# Altium footprint library AI.PcbLib: 137 footprints (part 2 of 9)
Each footprint in its own frame and in the unit in brackets; x right, y up, seen from the top. Pads: shape width x height; smd on the part's side, far side on the other; paste and mask are expansions set on the pad; w line width, h text height; cw(c..) or ccw(c..) is an arc to the next point about the centre after c.
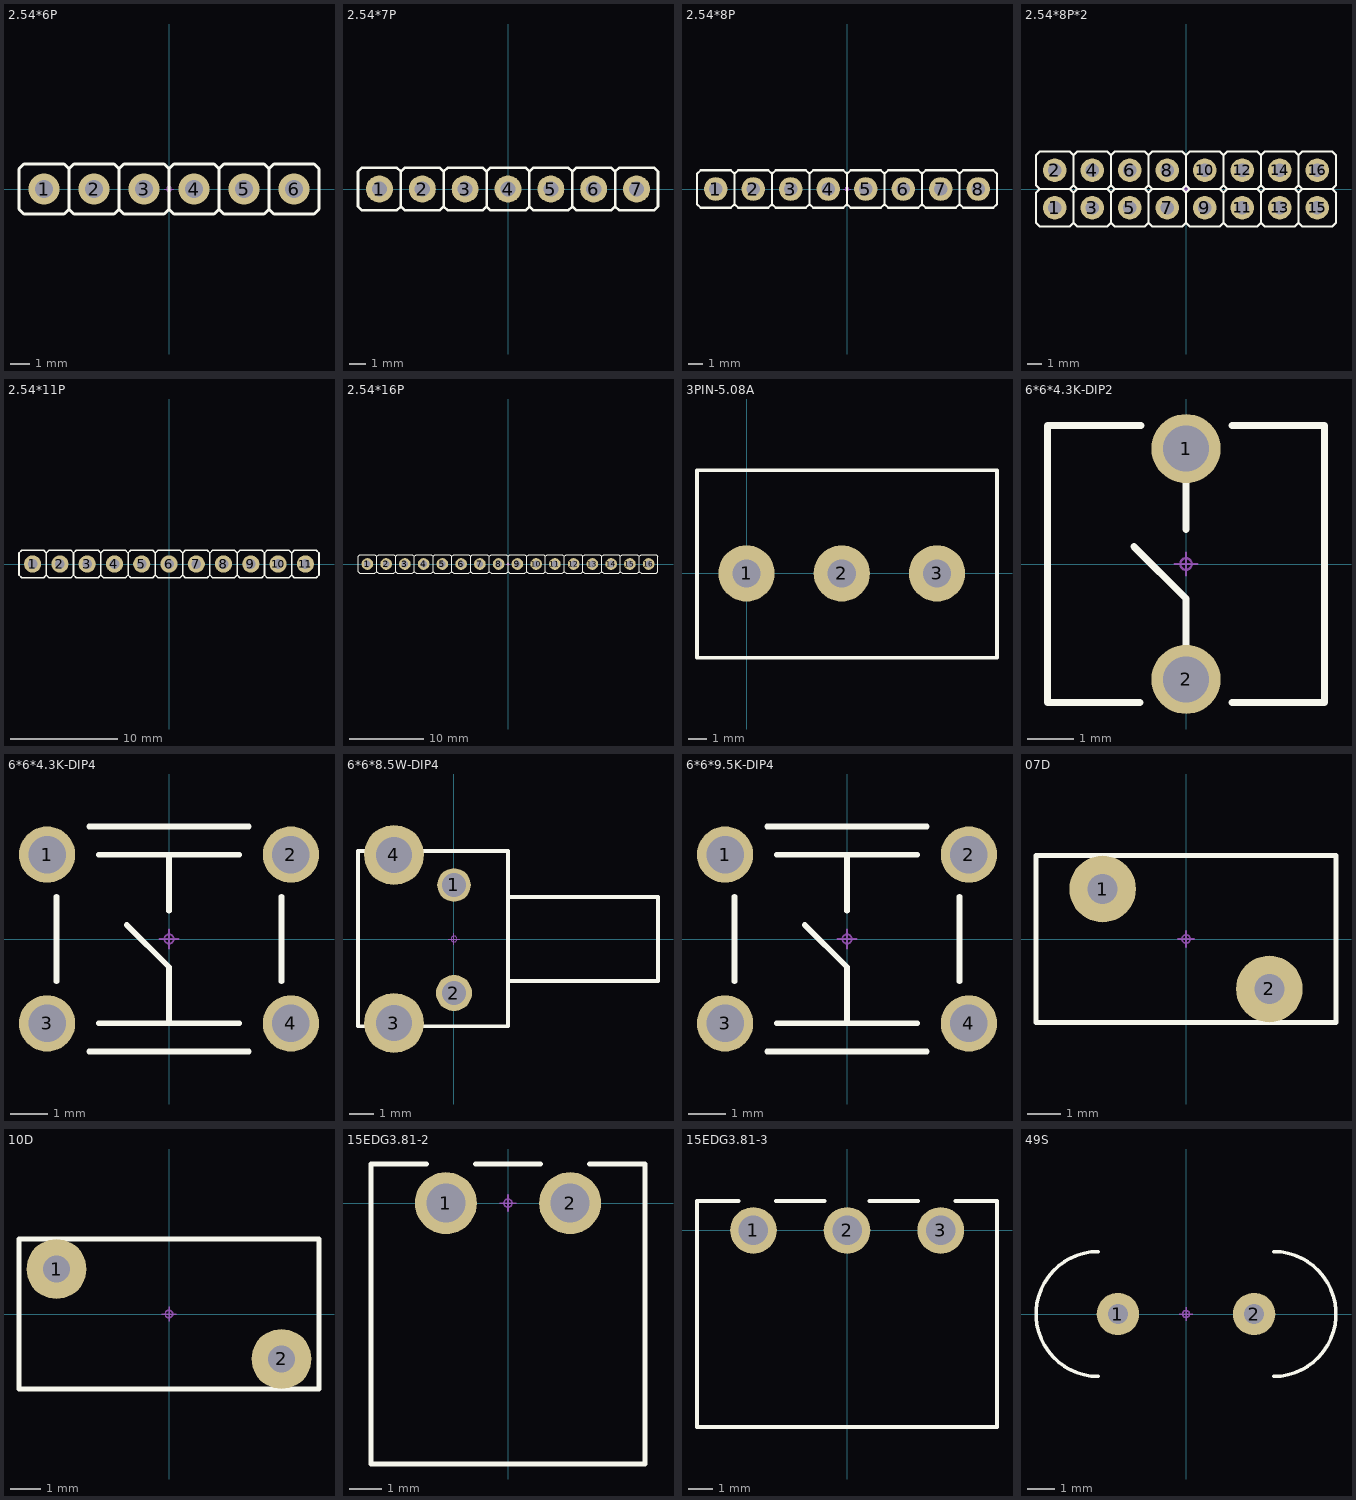
[diagram p1: the footprints below, top view; thin cyan lines are the x and y axes]

## 2.54*6P [mm]
pads (6):
  round 1.6 hole 0.9: 1(-6.35,0) 2(-3.81,0) 3(-1.27,0) 4(1.27,0) 5(3.81,0) 6(6.35,0)
Top Overlay:
  lines w0.152: -5.08,-1.025 -5.325,-1.27 -7.375,-1.27 -7.62,-1.025 -7.62,1.025 -7.375,1.27 -5.325,1.27 -5.08,1.025 ; -5.08,-1.025 -5.08,1.025 ; -5.08,-1.025 -4.835,-1.27 -2.785,-1.27 -2.54,-1.025 ; -5.08,1.025 -4.835,1.27 -2.785,1.27 -2.54,1.025 ; -2.54,-1.025 -2.54,1.025 ; -2.54,-1.025 -2.295,-1.27 -0.245,-1.27 0,-1.025 ; -2.54,1.025 -2.295,1.27 -0.245,1.27 0,1.025 ; 0,-1.025 0,1.025 ; 0,-1.025 0.245,-1.27 2.295,-1.27 2.54,-1.025 ; 0,1.025 0.245,1.27 2.295,1.27 2.54,1.025 ; 2.54,-1.025 2.785,-1.27 4.835,-1.27 5.08,-1.025 ; 2.54,-1.025 2.54,1.025 ; 2.54,1.025 2.785,1.27 4.835,1.27 5.08,1.025 ; 5.08,-1.025 5.325,-1.27 7.375,-1.27 7.62,-1.025 7.62,1.025 7.375,1.27 5.325,1.27 5.08,1.025 ; 5.08,-1.025 5.08,1.025
Mechanical 15:
  circle w0.05: c0,0 r0.125
  lines w0.05: -0.25,0 0.25,0 ; 0,-0.25 0,0.25
3D body "COMATEL_386.0358.1.06.440.stp": height 8, standoff -3.2, extent -7.62,-1.225 7.62,1.225

## 2.54*7P [mm]
pads (7):
  round 1.6 hole 0.9: 1(-7.62,0) 2(-5.08,0) 3(-2.54,0) 4(0,0) 5(2.54,0) 6(5.08,0) 7(7.62,0)
Top Overlay:
  lines w0.152: -6.35,-1.025 -6.595,-1.27 -8.645,-1.27 -8.89,-1.025 -8.89,1.025 -8.645,1.27 -6.595,1.27 -6.35,1.025 ; -6.35,-1.025 -6.35,1.025 ; -6.35,-1.025 -6.105,-1.27 -4.055,-1.27 -3.81,-1.025 ; -6.35,1.025 -6.105,1.27 -4.055,1.27 -3.81,1.025 ; -3.81,-1.025 -3.81,1.025 ; -3.81,-1.025 -3.565,-1.27 -1.515,-1.27 -1.27,-1.025 ; -3.81,1.025 -3.565,1.27 -1.515,1.27 -1.27,1.025 ; -1.27,-1.025 -1.27,1.025 ; -1.27,-1.025 -1.025,-1.27 1.025,-1.27 1.27,-1.025 ; -1.27,1.025 -1.025,1.27 1.025,1.27 1.27,1.025 ; 1.27,-1.025 1.27,1.025 ; 1.27,-1.025 1.515,-1.27 3.565,-1.27 3.81,-1.025 ; 1.27,1.025 1.515,1.27 3.565,1.27 3.81,1.025 ; 3.81,-1.025 3.81,1.025 ; 3.81,-1.025 4.055,-1.27 6.105,-1.27 6.35,-1.025 ; 3.81,1.025 4.055,1.27 6.105,1.27 6.35,1.025 ; 6.35,-1.025 6.35,1.025 ; 6.35,-1.025 6.595,-1.27 8.645,-1.27 8.89,-1.025 8.89,1.025 8.645,1.27 6.595,1.27 6.35,1.025
Mechanical 15:
  circle w0.05: c0,0 r0.125
  lines w0.05: -0.25,0 0.25,0 ; 0,-0.25 0,0.25
3D body: height 8.54, standoff -3, extent -8.89,-1.27 8.89,1.27

## 2.54*8P [mm]
pads (8):
  round 1.6 hole 0.9: 1(-8.89,0) 2(-6.35,0) 3(-3.81,0) 4(-1.27,0) 5(1.27,0) 6(3.81,0) 7(6.35,0) 8(8.89,0)
Top Overlay:
  lines w0.152: -7.62,-1.025 -7.375,-1.27 -5.325,-1.27 -5.08,-1.025 ; -7.62,-1.025 -7.62,1.025 ; -7.62,-1.025 -7.865,-1.27 -9.915,-1.27 -10.16,-1.025 -10.16,1.025 -9.915,1.27 -7.865,1.27 -7.62,1.025 ; -7.62,1.025 -7.375,1.27 -5.325,1.27 -5.08,1.025 ; -5.08,-1.025 -4.835,-1.27 -2.785,-1.27 -2.54,-1.025 ; -5.08,-1.025 -5.08,1.025 ; -5.08,1.025 -4.835,1.27 -2.785,1.27 -2.54,1.025 ; -2.54,-1.025 -2.295,-1.27 -0.245,-1.27 0,-1.025 ; -2.54,-1.025 -2.54,1.025 ; -2.54,1.025 -2.295,1.27 -0.245,1.27 0,1.025 ; 0,-1.025 0.245,-1.27 2.295,-1.27 2.54,-1.025 ; 0,-1.025 0,1.025 ; 0,1.025 0.245,1.27 2.295,1.27 2.54,1.025 ; 2.54,-1.025 2.785,-1.27 4.835,-1.27 5.08,-1.025 ; 2.54,-1.025 2.54,1.025 ; 2.54,1.025 2.785,1.27 4.835,1.27 5.08,1.025 ; 5.08,-1.025 5.325,-1.27 7.375,-1.27 7.62,-1.025 ; 5.08,-1.025 5.08,1.025 ; 5.08,1.025 5.325,1.27 7.375,1.27 7.62,1.025 ; 7.62,-1.025 7.865,-1.27 9.915,-1.27 10.16,-1.025 10.16,1.025 9.915,1.27 7.865,1.27 7.62,1.025 ; 7.62,-1.025 7.62,1.025
Mechanical 15:
  circle w0.05: c0,0 r0.125
  lines w0.05: -0.25,0 0.25,0 ; 0,-0.25 0,0.25
3D body "COMATEL_386.0358.1.08.440.stp": height 8, standoff -3.2, extent -10.16,-1.225 10.16,1.225

## 2.54*8P*2 [mm]
pads (16):
  round 1.6 hole 0.9: 1(-8.89,-1.27) 2(-8.89,1.27) 3(-6.35,-1.27) 4(-6.35,1.27) 5(-3.81,-1.27) 6(-3.81,1.27) 7(-1.27,-1.27) 8(-1.27,1.27) 9(1.27,-1.27) 10(1.27,1.27) 11(3.81,-1.27) 12(3.81,1.27) 13(6.35,-1.27) 14(6.35,1.27) 15(8.89,-1.27) 16(8.89,1.27)
Top Overlay:
  lines w0.152: -9.915,0 -7.865,0 ; -9.915,0 -10.16,-0.245 -10.16,-2.295 -9.915,-2.54 -7.865,-2.54 -7.62,-2.295 ; -9.915,0 -7.865,0 ; -9.915,0 -10.16,0.245 -10.16,2.295 -9.915,2.54 -7.865,2.54 -7.62,2.295 ; -7.865,0 -7.62,-0.245 ; -7.865,0 -7.62,0.245 ; -7.62,-2.295 -7.62,-0.245 ; -7.62,-2.295 -7.375,-2.54 -5.325,-2.54 -5.08,-2.295 ; -7.62,-0.245 -7.375,0 ; -7.62,0.245 -7.375,0 ; -7.62,0.245 -7.62,2.295 ; -7.62,2.295 -7.375,2.54 -5.325,2.54 -5.08,2.295 ; -7.375,0 -5.325,0 ; -7.375,0 -5.325,0 ; -5.325,0 -5.08,-0.245 ; -5.325,0 -5.08,0.245 ; -5.08,-2.295 -5.08,-0.245 ; -5.08,-2.295 -4.835,-2.54 -2.785,-2.54 -2.54,-2.295 ; -5.08,-0.245 -4.835,0 ; -5.08,0.245 -4.835,0 ; -5.08,0.245 -5.08,2.295 ; -5.08,2.295 -4.835,2.54 -2.785,2.54 -2.54,2.295 ; -4.835,0 -2.785,0 ; -4.835,0 -2.785,0 ; -2.785,0 -2.54,-0.245 ; -2.785,0 -2.54,0.245 ; -2.54,-2.295 -2.54,-0.245 ; -2.54,-2.295 -2.295,-2.54 -0.245,-2.54 0,-2.295 ; -2.54,-0.245 -2.295,0 ; -2.54,0.245 -2.295,0 ; -2.54,0.245 -2.54,2.295 ; -2.54,2.295 -2.295,2.54 -0.245,2.54 0,2.295 ; -2.295,0 -0.245,0 ; -2.295,0 -0.245,0 ; -0.245,0 0,-0.245 ; -0.245,0 0,0.245 ; 0,-2.295 0,-0.245 ; 0,-2.295 0.245,-2.54 2.295,-2.54 2.54,-2.295 ; 0,-0.245 0.245,0 ; 0,0.245 0.245,0 ; 0,0.245 0,2.295 ; 0,2.295 0.245,2.54 2.295,2.54 2.54,2.295 ; 0.245,0 2.295,0 ; 0.245,0 2.295,0 ; 2.295,0 2.54,-0.245 ; 2.295,0 2.54,0.245 ; 2.54,-2.295 2.54,-0.245 ; 2.54,-2.295 2.785,-2.54 4.835,-2.54 5.08,-2.295 ; 2.54,-0.245 2.785,0 ; 2.54,0.245 2.785,0 ; 2.54,0.245 2.54,2.295 ; 2.54,2.295 2.785,2.54 4.835,2.54 5.08,2.295 ; 2.785,0 4.835,0 ; 2.785,0 4.835,0 ; 4.835,0 5.08,-0.245 ; 4.835,0 5.08,0.245 ; 5.08,-2.295 5.08,-0.245 ; 5.08,-2.295 5.325,-2.54 7.375,-2.54 7.62,-2.295 ; 5.08,-0.245 5.325,0 ; 5.08,0.245 5.325,0 ; 5.08,0.245 5.08,2.295 ; 5.08,2.295 5.325,2.54 7.375,2.54 7.62,2.295 ; 5.325,0 7.375,0 ; 5.325,0 7.375,0 ; 7.375,0 7.62,-0.245 ; 7.375,0 7.62,0.245 ; 7.62,-2.295 7.62,-0.245 ; 7.62,-2.295 7.865,-2.54 9.915,-2.54 10.16,-2.295 10.16,-0.245 9.915,0 ; 7.62,-0.245 7.865,0 ; 7.62,0.245 7.865,0 ; 7.62,0.245 7.62,2.295 ; 7.62,2.295 7.865,2.54 9.915,2.54 10.16,2.295 10.16,0.245 9.915,0 ; 7.865,0 9.915,0 ; 7.865,0 9.915,0
Mechanical 15:
  circle w0.05: c0,0 r0.125
  lines w0.05: -0.25,0 0.25,0 ; 0,-0.25 0,0.25
3D body "COMATEL_386.0358.1.08.440.stp": height 8, standoff -3.2, extent -10.16,-2.495 10.16,-0.045
3D body "COMATEL_386.0358.1.08.440.stp": height 8, standoff -3.2, extent -10.16,0.045 10.16,2.495

## 2.54*11P [mm]
pads (11):
  round 1.6 hole 0.9: 1(-12.7,0) 2(-10.16,0) 3(-7.62,0) 4(-5.08,0) 5(-2.54,0) 6(0,0) 7(2.54,0) 8(5.08,0) 9(7.62,0) 10(10.16,0) 11(12.7,0)
Top Overlay:
  lines w0.152: 6.35,1.025 6.35,-1.025 ; -11.43,-1.025 -11.675,-1.27 -13.725,-1.27 -13.97,-1.025 -13.97,1.025 -13.725,1.27 -11.675,1.27 -11.43,1.025 ; -11.43,-1.025 -11.43,1.025 ; -11.43,-1.025 -11.185,-1.27 -9.135,-1.27 -8.89,-1.025 ; -11.43,1.025 -11.185,1.27 -9.135,1.27 -8.89,1.025 ; -8.89,-1.025 -8.89,1.025 ; -8.89,-1.025 -8.645,-1.27 -6.595,-1.27 -6.35,-1.025 ; -8.89,1.025 -8.645,1.27 -6.595,1.27 -6.35,1.025 ; -6.35,-1.025 -6.35,1.025 ; -6.35,-1.025 -6.105,-1.27 -4.055,-1.27 -3.81,-1.025 ; -6.35,1.025 -6.105,1.27 -4.055,1.27 -3.81,1.025 ; -3.81,-1.025 -3.81,1.025 ; -3.81,-1.025 -3.565,-1.27 -1.515,-1.27 -1.27,-1.025 ; -3.81,1.025 -3.565,1.27 -1.515,1.27 -1.27,1.025 ; -1.27,-1.025 -1.27,1.025 ; -1.27,-1.025 -1.025,-1.27 1.025,-1.27 1.27,-1.025 ; -1.27,1.025 -1.025,1.27 1.025,1.27 1.27,1.025 ; 1.27,-1.025 1.27,1.025 ; 1.27,-1.025 1.515,-1.27 3.565,-1.27 3.81,-1.025 ; 1.27,1.025 1.515,1.27 3.565,1.27 3.81,1.025 ; 3.81,-1.025 3.81,1.025 ; 3.81,-1.025 4.055,-1.27 6.105,-1.27 6.35,-1.025 ; 3.81,1.025 4.055,1.27 6.105,1.27 6.355,1.021 6.604,1.27 8.645,1.27 8.89,1.025 ; 6.35,-1.025 6.595,-1.27 8.645,-1.27 8.89,-1.025 ; 8.89,-1.025 9.135,-1.27 11.185,-1.27 11.43,-1.025 ; 8.89,-1.025 8.89,1.025 ; 8.89,1.025 9.135,1.27 11.185,1.27 11.43,1.025 ; 11.43,-1.025 11.675,-1.27 13.725,-1.27 13.97,-1.025 13.97,1.025 13.725,1.27 11.675,1.27 11.43,1.025 ; 11.43,-1.025 11.43,1.025
Mechanical 15:
  circle w0.05: c0,0 r0.125
  lines w0.05: -0.25,0 0.25,0 ; 0,-0.25 0,0.25
3D body: height 8.54, standoff -3, extent -13.97,-1.27 13.97,1.27

## 2.54*16P [mm]
pads (16):
  round 1.6 hole 0.9: 1(-19.05,0) 2(-16.51,0) 3(-13.97,0) 4(-11.43,0) 5(-8.89,0) 6(-6.35,0) 7(-3.81,0) 8(-1.27,0) 9(1.27,0) 10(3.81,0) 11(6.35,0) 12(8.89,0) 13(11.43,0) 14(13.97,0) 15(16.51,0) 16(19.05,0)
Top Overlay:
  lines w0.152: 0,1.025 0,-1.025 ; -17.78,-1.025 -17.535,-1.27 -15.485,-1.27 -15.24,-1.025 ; -17.78,-1.025 -17.78,1.025 ; -17.78,-1.025 -18.025,-1.27 -20.075,-1.27 -20.32,-1.025 -20.32,1.025 -20.075,1.27 -18.025,1.27 -17.78,1.025 ; -17.78,1.025 -17.535,1.27 -15.485,1.27 -15.24,1.025 ; -15.24,-1.025 -14.995,-1.27 -12.945,-1.27 -12.7,-1.025 ; -15.24,-1.025 -15.24,1.025 ; -15.24,1.025 -14.995,1.27 -12.945,1.27 -12.7,1.025 ; -12.7,-1.025 -12.455,-1.27 -10.405,-1.27 -10.16,-1.025 ; -12.7,-1.025 -12.7,1.025 ; -12.7,1.025 -12.455,1.27 -10.405,1.27 -10.16,1.025 ; -10.16,-1.025 -9.915,-1.27 -7.865,-1.27 -7.62,-1.025 ; -10.16,-1.025 -10.16,1.025 ; -10.16,1.025 -9.915,1.27 -7.865,1.27 -7.62,1.025 ; -7.62,-1.025 -7.375,-1.27 -5.325,-1.27 -5.08,-1.025 ; -7.62,-1.025 -7.62,1.025 ; -7.62,1.025 -7.375,1.27 -5.325,1.27 -5.08,1.025 ; -5.08,-1.025 -4.835,-1.27 -2.785,-1.27 -2.54,-1.025 ; -5.08,-1.025 -5.08,1.025 ; -5.08,1.025 -4.835,1.27 -2.785,1.27 -2.54,1.025 ; -2.54,-1.025 -2.295,-1.27 -0.245,-1.27 0,-1.025 ; -2.54,-1.025 -2.54,1.025 ; -2.54,1.025 -2.295,1.27 -0.245,1.27 0.005,1.021 0.254,1.27 2.295,1.27 2.54,1.025 ; 0,-1.025 0.245,-1.27 2.295,-1.27 2.54,-1.025 ; 2.54,-1.025 2.54,1.025 ; 2.54,-1.025 2.785,-1.27 4.835,-1.27 5.08,-1.025 ; 2.54,1.025 2.785,1.27 4.835,1.27 5.08,1.025 ; 5.08,-1.025 5.08,1.025 ; 5.08,-1.025 5.325,-1.27 7.375,-1.27 7.62,-1.025 ; 5.08,1.025 5.325,1.27 7.375,1.27 7.62,1.025 ; 7.62,-1.025 7.62,1.025 ; 7.62,-1.025 7.865,-1.27 9.915,-1.27 10.16,-1.025 ; 7.62,1.025 7.865,1.27 9.915,1.27 10.16,1.025 ; 10.16,-1.025 10.16,1.025 ; 10.16,-1.025 10.405,-1.27 12.455,-1.27 12.7,-1.025 ; 10.16,1.025 10.405,1.27 12.455,1.27 12.7,1.025 ; 12.7,-1.025 12.7,1.025 ; 12.7,-1.025 12.945,-1.27 14.995,-1.27 15.24,-1.025 ; 12.7,1.025 12.945,1.27 14.995,1.27 15.24,1.025 ; 15.24,-1.025 15.24,1.025 ; 15.24,-1.025 15.485,-1.27 17.535,-1.27 17.78,-1.025 ; 15.24,1.025 15.485,1.27 17.535,1.27 17.78,1.025 ; 17.78,-1.025 17.78,1.025 ; 17.78,-1.025 18.025,-1.27 20.075,-1.27 20.32,-1.025 20.32,1.025 20.075,1.27 18.025,1.27 17.78,1.025
Mechanical 15:
  circle w0.05: c0,0 r0.125
  lines w0.05: -0.25,0 0.25,0 ; 0,-0.25 0,0.25
3D body "HDR1x16.STEP": height 8.54, standoff -3, extent -20.32,-1.27 20.32,1.27

## 3PIN-5.08A [mm] "3A"
pads (3):
  round 3 hole 1.5: 1(0,0) 2(5.08,0) 3(10.16,0)
Top Overlay:
  lines w0.2: -2.642,-4.5 13.36,-4.5 13.36,5.5 -2.642,5.5 -2.642,-4.5
3D body "PHOENIX_1715734.stp": height 14.19, standoff -3.5, extent -2.661,-4.8 13.32,5

## 6*6*4.3K-DIP2 [mm]
pads (2):
  round 1.5 hole 1: 1(0,2.5) 2(0,-2.5)
Top Overlay:
  lines w0.152: -1.125,0.375 0,-0.75 0,-2.25 ; -1,-3 -3,-3 -3,3 -0.975,3 ; 0,0.75 0,2.25 ; 1,-3 3,-3 3,3 1,3
Mechanical 15:
  circle w0.05: c0,0 r0.125
  lines w0.05: -0.25,0 0.25,0 ; 0,-0.25 0,0.25
3D body "SW6X6.stp": height 4.3, standoff -14, extent -3.1,-3 3.1,3

## 6*6*4.3K-DIP4 [mm]
pads (4):
  round 1.5 hole 1: 1(-3.25,2.25) 2(3.25,2.25) 3(-3.25,-2.25) 4(3.25,-2.25)
Top Overlay:
  lines w0.152: -3,-1.125 -3,1.125 ; -2.125,-3 2.125,-3 ; -2.125,3 2.125,3 ; -1.875,-2.25 1.875,-2.25 ; -1.875,2.25 1.875,2.25 ; -1.125,0.375 0,-0.75 0,-2.25 ; 0,0.75 0,2.25 ; 3,-1.125 3,1.125
Mechanical 15:
  circle w0.05: c0,0 r0.125
  lines w0.05: -0.25,0 0.25,0 ; 0,-0.25 0,0.25
3D body "PB_OMRON_B3F-1000.stp": height 4.3, standoff -3.6, extent -3.4,-3.1 3.4,3.1

## 6*6*8.5W-DIP4 [mm]
pads (4):
  round 1.397 hole 1: 1(0,2.25)
  round 1.5 hole 1: 2(0,-2.25)
  round 2.5 hole 1.5: 3(-2.5,-3.5) 4(-2.5,3.5)
Top Overlay:
  lines w0.152: 2.25,-1.75 8.5,-1.75 8.5,1.75 2.25,1.75 ; -4,-3.634 2.25,-3.634 2.25,3.666 -4,3.666 -4,-3.634
Mechanical 15:
  circle w0.05: c0,0 r0.125
  lines w0.05: -0.25,0 0.25,0 ; 0,-0.25 0,0.25
3D body "qingchukaiguan.stp": height 7.4, standoff -3.2, extent -4.2,-4.35 8.6,4.35

## 6*6*9.5K-DIP4 [mm]
pads (4):
  round 1.5 hole 1: 1(-3.25,2.25) 2(3.25,2.25) 3(-3.25,-2.25) 4(3.25,-2.25)
Top Overlay:
  lines w0.152: -3,-1.125 -3,1.125 ; -2.125,-3 2.125,-3 ; -2.125,3 2.125,3 ; -1.875,-2.25 1.875,-2.25 ; -1.875,2.25 1.875,2.25 ; -1.125,0.375 0,-0.75 0,-2.25 ; 0,0.75 0,2.25 ; 3,-1.125 3,1.125
Mechanical 15:
  circle w0.05: c0,0 r0.125
  lines w0.05: -0.25,0 0.25,0 ; 0,-0.25 0,0.25
3D body "PB_OMRON_B3F-1070.stp": height 9.5, standoff -3.6, extent -3.4,-3.1 3.4,3.1

## 07D [mm]
pads (2):
  round 2 hole 0.9: 1(-2.5,1.5) 2(2.5,-1.5)
Top Overlay:
  lines w0.152: -4.5,-2.5 -4.5,2.5 4.5,2.5 4.5,-2.5 -4.5,-2.5
Mechanical 15:
  circle w0.05: c0,0 r0.125
  lines w0.05: -0.25,0 0.25,0 ; 0,-0.25 0,0.25
3D body "VAR_EPCOS_B72205S0461K101.stp": height 9, standoff -3.6, extent -3.5,-2.85 3.5,2.85

## 10D [mm]
pads (2):
  round 2 hole 0.9: 1(-3.75,1.5) 2(3.75,-1.5)
Top Overlay:
  lines w0.152: -5,-2.5 -5,2.5 5,2.5 5,-2.5 -5,-2.5
Mechanical 15:
  circle w0.05: c0,0 r0.125
  lines w0.05: -0.25,0 0.25,0 ; 0,-0.25 0,0.25
3D body "VAR_EPCOS_B72210S0461K101.stp": height 15, standoff -3.6, extent -6,-3.15 6,3.15

## 15EDG3.81-2 [mm]
pads (2):
  round 1.9 hole 1.2: 1(-1.905,0) 2(1.905,0)
Top Overlay:
  lines w0.152: -2.5,1.2 -4.2,1.2 -4.2,-8 4.2,-8 4.2,1.2 2.5,1.2 ; -1,1.2 1,1.2
Mechanical 15:
  circle w0.05: c0,0 r0.125
  lines w0.05: -0.25,0 0.25,0 ; 0,-0.25 0,0.25
3D body "PHOENIX_1844210.stp": height 7.25, standoff -3.4, extent -4.2,-8 4.2,1.2

## 15EDG3.81-3 [mm]
pads (3):
  round 1.9 hole 1.2: 1(-3.81,0) 2(0,0) 3(3.81,0)
Top Overlay:
  lines w0.152: -4.405,1.2 -6.105,1.2 -6.105,-8 6.1,-8 6.1,1.2 4.4,1.2 ; -2.905,1.2 -0.905,1.2 ; 0.9,1.2 2.9,1.2
Mechanical 15:
  circle w0.05: c0,0 r0.125
  lines w0.05: -0.25,0 0.25,0 ; 0,-0.25 0,0.25
3D body "PHOENIX_1844210.stp": height 7.25, standoff -3.4, extent -6.105,-8 2.295,1.2
3D body "PHOENIX_1844210.stp": height 7.25, standoff -3.4, extent -2.3,-8 6.1,1.2

## 49S [mil]
pads (2):
  round 60 hole 28: 1(-96.46,0) 2(96.46,0)
Top Overlay:
  lines w5: -124,-88.5 cw(c-124,0) -124,88.5 ; 124,-88.5 ccw(c124,0) 124,88.5
Mechanical 15:
  circle w1.97: c0,0 r4.92
  lines w1.97: -9.84,0 9.84,0 ; 0,-9.84 0,9.84
3D body "hc-49s_n.stp": height 137.8, standoff -118.11, extent -212.59,-88.58 212.6,88.59